# Altium footprint library Connector.PcbLib: 59 footprints (part 4 of 4)
Each footprint in its own frame and in the unit in brackets; x right, y up, seen from the top. Pads: shape width x height; smd on the part's side, far side on the other; paste and mask are expansions set on the pad; w line width, h text height; cw(c..) or ccw(c..) is an arc to the next point about the centre after c.
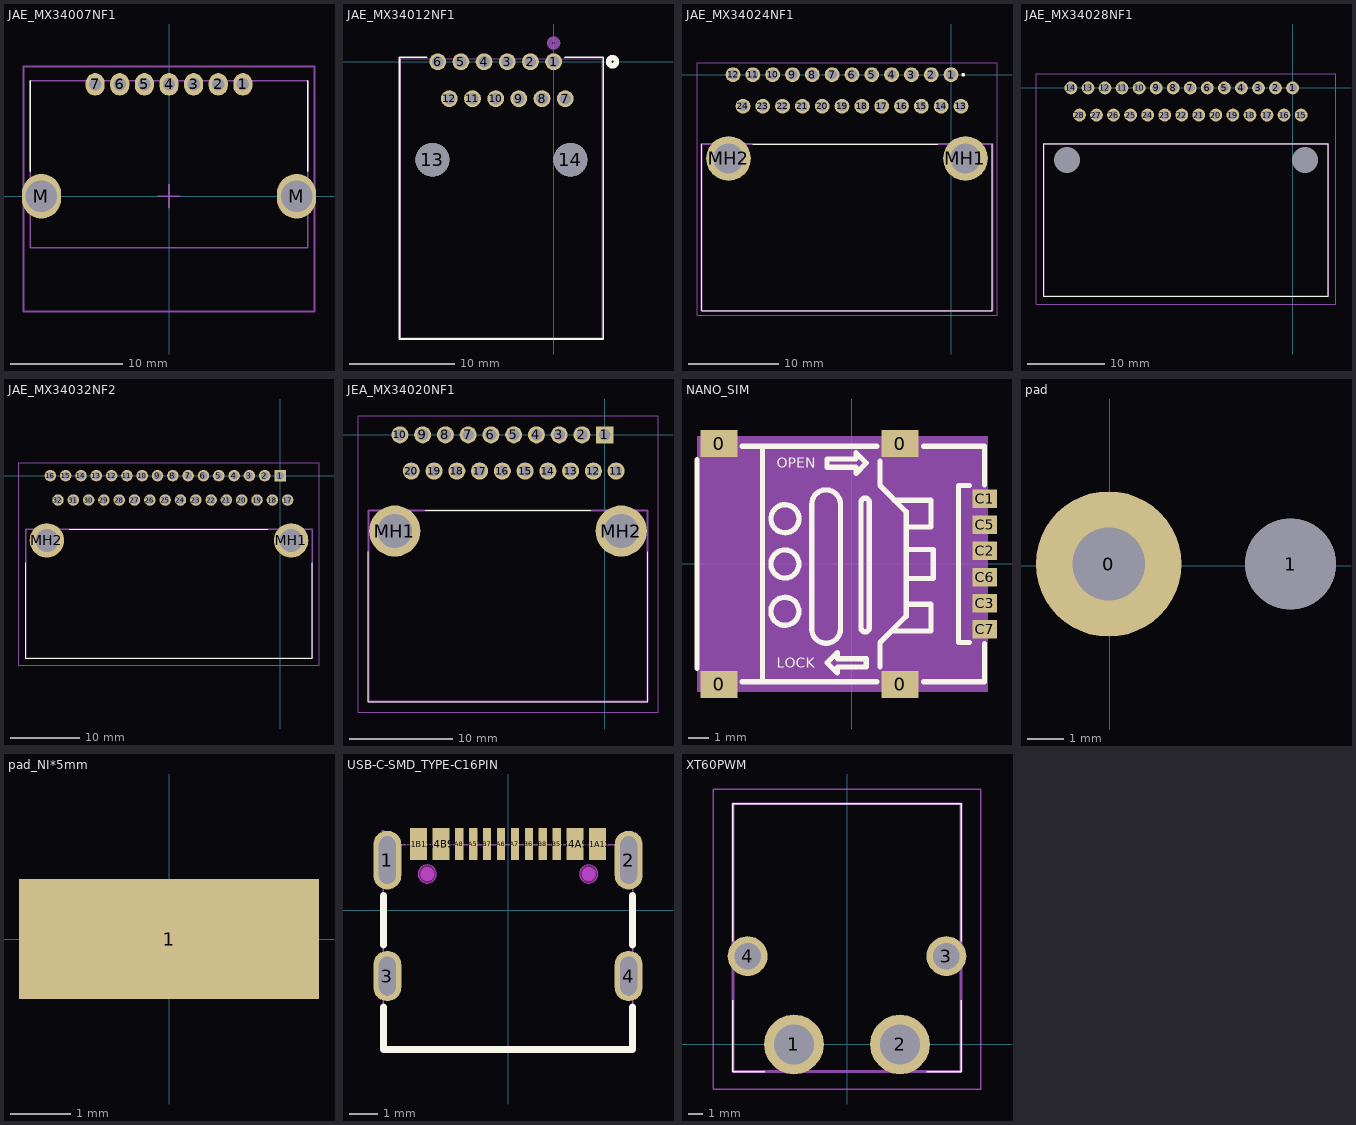
[diagram p3: the footprints below, top view; thin cyan lines are the x and y axes]

## JAE_MX34007NF1 [mm]
pads (9):
  oval 1.7x2 hole 1.1: 1(6.6,10) 2(4.4,10) 3(2.2,10) 4(0,10) 5(-2.2,10) 6(-4.4,10) 7(-6.6,10)
  oval 3.5x4 hole 2.8: M(-11.4,0) M(11.4,0)
Top Overlay:
  lines w0.152: -12.4,2.25 -12.4,10.32 ; 12.4,2.25 12.4,10.32
Mechanical 13:
  lines w0.152: -12.4,-4.6 -12.4,10.32 0,10.32 12.4,10.32 12.4,-4.6 0,-4.6 -12.4,-4.6
Mechanical 15:
  lines w0.152: -1,0 1,0 ; -0.5,-10.3 13,-10.3 13,11.6 0,11.6 -13,11.6 -13,-10.3 0.5,-10.3 ; 0,-1 0,1
3D body "K3D-MX34007NF1-V1_JAE_Proprietary.stp": height 10.7, standoff -3.2, extent -12.4,-10.3 12.4,10.32
3D body "K3D-MX34007SF1-V3_JAE_Proprietary.STEP": height 12.9, standoff 0.7, extent -9.8,-16.5 9.8,4.8

## JAE_MX34012NF1 [mm]
pads (14):
  round 1.6 hole 1.1: 1(0,0) 2(-2.2,0) 3(-4.4,0) 4(-6.6,0) 5(-8.8,0) 6(-11,0) 7(1.1,-3.5) 8(-1.1,-3.5) 9(-3.3,-3.5) 10(-5.5,-3.5) 11(-7.7,-3.5) 12(-9.9,-3.5)
  round 3.2 hole 3.2 unplated: 13(-11.5,-9.3) 14(1.6,-9.3)
Top Overlay:
  circle w0.508: c5.588,0 r0.381
  lines w0.152: -12.049,0.427 -14.627,0.427 -14.627,-26.319 4.727,-26.319 4.727,0.427 1.049,0.427
Bottom Overlay:
  circle w0.508: c5.588,0 r0.381
Mechanical 13:
  circle w0.508: c0,1.778 r0.381
  lines w0.025: -14.5,-26.192 -14.5,0.3 4.6,0.3 4.6,-26.192 -14.5,-26.192
3D body "K3D-MX34012NF1-V3_JAE_Proprietary.STEP": height 16, standoff -3.2, extent -14.55,-26.2 4.55,0.32
3D body "K3D-MX34012SF1-V3_JAE_Proprietary.STEP": height 18.2, standoff 3, extent -13.15,-36 3.15,-14.7

## JAE_MX34024NF1 [mm]
pads (26):
  round 1.65 hole 1.1: 1(0,0) 2(-2.2,0) 3(-4.4,0) 4(-6.6,0) 5(-8.8,0) 6(-11,0) 7(-13.2,0) 8(-15.4,0) 9(-17.6,0) 10(-19.8,0) 11(-22,0) 12(-24.2,0) 13(1.1,-3.5) 14(-1.1,-3.5) 15(-3.3,-3.5) 16(-5.5,-3.5) 17(-7.7,-3.5) 18(-9.9,-3.5) 19(-12.1,-3.5) 20(-14.3,-3.5) 21(-16.5,-3.5) 22(-18.7,-3.5) 23(-20.9,-3.5) 24(-23.1,-3.5)
  round 4.95 hole 3.3: MH1(1.6,-9.3) MH2(-24.7,-9.3)
Top Overlay:
  lines w0.1: -27.7,-7.7 -27.7,-26.2 4.6,-26.2 4.6,-7.7 ; -22,-7.7 -1.5,-7.7
  lines w0.2: 1.35,-0.1 cw(c1.35,0) 1.35,0.1 cw(c1.35,0) 1.35,-0.1
Mechanical 13:
  lines w0.2: -27.7,-26.2 4.6,-26.2 4.6,-7.7 -27.7,-7.7 -27.7,-26.2
Mechanical 15:
  lines w0.1: -28.2,-26.7 5.1,-26.7 5.1,1.325 -28.2,1.325 -28.2,-26.7
3D body "K3D-MX34024NF1-V3_JAE.stp": height 16, standoff -3.2, extent -27.656,-26.108 4.644,0.412

## JAE_MX34028NF1 [mm]
pads (30):
  round 1.65 hole 1.1: 1(0,0) 2(-2.2,0) 3(-4.4,0) 4(-6.6,0) 5(-8.8,0) 6(-11,0) 7(-13.2,0) 8(-15.4,0) 9(-17.6,0) 10(-19.8,0) 11(-22,0) 12(-24.2,0) 13(-26.4,0) 14(-28.6,0) 15(1.1,-3.5) 16(-1.1,-3.5) 17(-3.3,-3.5) 18(-5.5,-3.5) 19(-7.7,-3.5) 20(-9.9,-3.5) 21(-12.1,-3.5) 22(-14.3,-3.5) 23(-16.5,-3.5) 24(-18.7,-3.5) 25(-20.9,-3.5) 26(-23.1,-3.5) 27(-25.3,-3.5) 28(-27.5,-3.5)
  round 1.65 hole 3.3 unplated: MH1(-29.1,-9.3) MH2(1.6,-9.3)
Top Overlay:
  lines w0.1: -32.1,-26.9 -32.1,-7.2 4.6,-7.2 4.6,-26.9 -32.1,-26.9
Mechanical 13:
  lines w0.2: -32.1,-26.9 -32.1,-7.2 4.6,-7.2 4.6,-26.9 -32.1,-26.9
Mechanical 15:
  lines w0.1: -33.1,-27.9 -33.1,1.825 5.6,1.825 5.6,-27.9 -33.1,-27.9
3D body "K3D-MX34028NF2-V2_JAE.stp": height 16, standoff -3.2, extent -32.181,-26.112 4.519,0.408

## JAE_MX34032NF2 [mm]
pads (34):
  rect 1.65x1.65 hole 1.1: 1(0,0)
  round 1.65 hole 1.1: 2(-2.2,0) 3(-4.4,0) 4(-6.6,0) 5(-8.8,0) 6(-11,0) 7(-13.2,0) 8(-15.4,0) 9(-17.6,0) 10(-19.8,0) 11(-22,0) 12(-24.2,0) 13(-26.4,0) 14(-28.6,0) 15(-30.8,0) 16(-33,0) 17(1.1,-3.5) 18(-1.1,-3.5) 19(-3.3,-3.5) 20(-5.5,-3.5) 21(-7.7,-3.5) 22(-9.9,-3.5) 23(-12.1,-3.5) 24(-14.3,-3.5) 25(-16.5,-3.5) 26(-18.7,-3.5) 27(-20.9,-3.5) 28(-23.1,-3.5) 29(-25.3,-3.5) 30(-27.5,-3.5) 31(-29.7,-3.5) 32(-31.9,-3.5)
  round 4.95 hole 3.3: MH1(1.6,-9.3) MH2(-33.5,-9.3)
Top Overlay:
  lines w0.1: -36.5,-26.2 -36.5,-12.5 -36.5,-26.2 ; -36.5,-26.2 4.6,-26.2 ; -36.5,-26.2 4.6,-26.2 ; 4.6,-26.2 4.6,-12.5 4.6,-26.2 ; -30.25,-7.7 -1.75,-7.7 -30.25,-7.7
Mechanical 13:
  lines w0.2: -36.5,-26.2 4.6,-26.2 4.6,-7.7 -36.5,-7.7 -36.5,-26.2
Mechanical 15:
  lines w0.1: -37.5,-27.2 5.6,-27.2 5.6,1.825 -37.5,1.825 -37.5,-27.2
3D body "K3D-MX34032NF2-V2_JAE.stp": height 16, standoff -3.2, extent -36.477,-26.187 4.623,0.333

## JEA_MX34020NF1 [mm]
pads (22):
  rect 1.65x1.65 hole 1.1: 1(0,0)
  round 1.65 hole 1.1: 2(-2.2,0) 3(-4.4,0) 4(-6.6,0) 5(-8.8,0) 6(-11,0) 7(-13.2,0) 8(-15.4,0) 9(-17.6,0) 10(-19.8,0) 11(1.1,-3.5) 12(-1.1,-3.5) 13(-3.3,-3.5) 14(-5.5,-3.5) 15(-7.7,-3.5) 16(-9.9,-3.5) 17(-12.1,-3.5) 18(-14.3,-3.5) 19(-16.5,-3.5) 20(-18.7,-3.5)
  round 4.95 hole 3.3: MH1(-20.3,-9.3) MH2(1.6,-9.3)
Top Overlay:
  lines w0.1: -22.85,-11.3 -22.85,-25.8 4.15,-25.8 4.15,-11.3 ; -17.35,-7.3 -1.35,-7.3
Mechanical 13:
  lines w0.2: -22.85,-25.8 -22.85,-7.3 4.15,-7.3 4.15,-25.8 -22.85,-25.8
Mechanical 15:
  lines w0.1: -23.85,-26.8 -23.85,1.825 5.15,1.825 5.15,-26.8 -23.85,-26.8
3D body "K3D-MX34020NF1-V3_JAE.stp": height 16, standoff -3.2, extent -23.404,-26.163 4.496,0.357

## NANO_SIM [mm]
pads (10):
  rect 1.8x1.3 smd: 0(-6.451,-5.853) 0(-6.451,5.853) 0(2.349,-5.853) 0(2.349,5.853)
  rect 1.2x0.9 smd: C1(6.451,3.173) C2(6.451,0.633) C3(6.451,-1.907) C5(6.451,1.903) C6(6.451,-0.637) C7(6.451,-3.177)
Top Overlay:
  circle w0.254: c-3.251,-2.3 r0.68
  circle w0.254: c-3.251,0 r0.68
  circle w0.254: c-3.249,2.198 r0.68
  lines w0.254: -7.521,-5.08 -7.521,5.08 ; -5.32,-5.715 0.422,-5.715 1.218,-5.715 ; -5.32,5.715 1.218,5.715 ; -4.346,-5.715 -4.346,5.715 ; -1.951,-3.2 -1.951,2.9 cw(c-1.251,2.9) -0.551,2.9 ; -1.951,-3.15 ccw(c-1.251,-3.15) -0.551,-3.15 -0.551,2.95 ; 0.449,-3.1 ccw(c0.649,-3.1) 0.849,-3.1 ; 0.449,-3.099 0.449,3 cw(c0.649,3) 0.849,3 0.848,-3.099 ; 1.369,-4.986 1.369,-3.81 2.639,-2.54 2.639,2.54 1.369,3.81 1.369,4.986 ; 2.049,-3.25 3.849,-3.25 3.849,-1.95 2.649,-1.95 ; 2.049,3.1 3.849,3.1 3.849,1.8 2.649,1.8 ; 2.649,-0.7 2.649,-0.701 3.95,-0.701 3.95,0.701 2.649,0.701 2.649,0.7 ; 3.48,-5.715 6.449,-5.715 6.449,-3.858 ; 3.48,5.715 6.264,5.715 6.449,5.715 6.449,3.855 ; 5.712,-3.81 5.179,-3.81 5.179,3.81 5.716,3.81 ; -1.201,-4.8 -0.701,-5.3 -0.701,-5.001 0.399,-5.001 0.699,-5.001 0.699,-4.599 -0.701,-4.599 -0.701,-4.3 -1.201,-4.8 ; -1.201,4.699 0.199,4.699 0.199,4.4 0.699,4.9 0.198,5.4 0.199,5.101 -0.901,5.101 -1.201,5.101 -1.201,4.699
  text "OPEN" at -3.651,4.678 h0.5
  text "LOCK" at -3.651,-5.05 h0.5
Mechanical 15:
  circle w0.152: c0,0 r0.35
  region: -7.5,6.2 -7.5,-6.2 6.6,-6.2 6.6,6.2
  lines w0.152: -0.5,0 0.5,0 ; 0,-0.5 0,0.5

## pad [mm]
pads (2):
  round 4 hole 2: 0(-0.021,0.044)
  round 2.5 hole 2.5 unplated: 1(4.979,0.044)

## pad_NI*5mm [mm]
pads (1):
  rect 5x2 smd: 1(0,0)

## USB-C-SMD_TYPE-C16PIN [mm]
pads (16):
  oval 1x2.1 hole 0.6 slot 1.7 at 90 deg: 1(-4.32,1.787) 2(4.32,1.787)
  oval 1x1.8 hole 0.6 slot 1.4 at 90 deg: 3(-4.32,-2.362) 4(4.32,-2.362)
  rect 0.6x1.15 smd paste-100: A1B12(-3.2,2.362) A4B9(-2.4,2.362) B1A12(3.2,2.362) B4A9(2.4,2.362)
  rect 0.3x1.15 smd paste-100: A5(-1.25,2.362) A6(-0.25,2.362) A7(0.25,2.362) A8(-1.75,2.362) B5(1.75,2.362) B6(0.75,2.362) B7(-0.75,2.362) B8(1.25,2.362)
Top Overlay:
  lines w0.254: -4.45,-3.482 -4.45,-5 4.45,-5 4.45,-3.482 ; -4.45,-1.243 -4.45,0.518 ; 4.45,-1.243 4.45,0.518
Top Paste:
  drawing of 16 lines, arcs and shapes, not listed
Keep-Out Layer:
  board cut-out: 3.215,1.288 3.215,1.353 3.166,1.472 3.074,1.564 2.955,1.613 2.825,1.613 2.706,1.564 2.615,1.472 2.565,1.353 2.565,1.288 2.565,1.224 2.614,1.104 2.706,1.013 2.825,0.963 2.955,0.963 3.074,1.013 3.165,1.104 3.215,1.223 3.215,1.288
  board cut-out: -2.565,1.288 -2.565,1.353 -2.614,1.472 -2.706,1.564 -2.825,1.613 -2.955,1.613 -3.074,1.564 -3.165,1.472 -3.215,1.353 -3.215,1.288 -3.215,1.224 -3.166,1.104 -3.074,1.013 -2.955,0.963 -2.825,0.963 -2.706,1.013 -2.615,1.104 -2.565,1.223 -2.565,1.288
Mechanical 1:
  circle w0.005: c2.89,1.288 r0.325
  circle w0.005: c-2.89,1.288 r0.325
Mechanical 6:
  circle w0.25: c-2.89,1.288 r0.125
  circle w0.25: c2.89,1.288 r0.125
Mechanical 15:
  region: -4.41,2.803 -4.411,2.827 -4.446,2.86 -4.494,2.86 -4.529,2.827 -4.53,2.803 -4.529,2.778 -4.494,2.745 -4.446,2.745 -4.411,2.778 -4.41,2.803
  region: -3.4,2.802 -3,2.802 -3,2.102 -3.4,2.102
  region: -2.6,2.802 -2.2,2.802 -2.2,2.102 -2.6,2.102
  region: 2.2,2.802 2.6,2.802 2.6,2.102 2.2,2.102
  region: 3,2.802 3.4,2.802 3.4,2.102 3,2.102
  region: -1.35,2.802 -1.15,2.802 -1.15,2.102 -1.35,2.102
  region: -0.85,2.802 -0.65,2.802 -0.65,2.102 -0.85,2.102
  region: -0.35,2.802 -0.15,2.802 -0.15,2.102 -0.35,2.102
  region: 0.15,2.802 0.35,2.802 0.35,2.102 0.15,2.102
  region: 0.65,2.802 0.85,2.802 0.85,2.102 0.65,2.102
  region: 1.15,2.802 1.35,2.802 1.35,2.102 1.15,2.102
  region: 1.65,2.802 1.85,2.802 1.85,2.102 1.65,2.102
  region: -4.47,2.337 -4.17,2.337 -4.17,1.237 -4.47,1.237
  region: 4.17,2.337 4.47,2.337 4.47,1.237 4.17,1.237
  region: 4.17,-1.962 4.47,-1.962 4.47,-2.762 4.17,-2.762
  region: -4.47,-1.962 -4.17,-1.962 -4.17,-2.762 -4.47,-2.762
  region: -1.85,2.803 -1.65,2.803 -1.65,2.103 -1.85,2.103
  lines w0.051: -4.47,-5.012 -4.47,2.338 4.47,2.338 4.47,-5.012 -4.47,-5.012

## XT60PWM [mm]
pads (4):
  round 4.05 hole 2.7: 1(-3.6,0) 2(3.6,0)
  round 2.7 hole 1.8: 3(6.75,6) 4(-6.75,6)
Top Overlay:
  lines w0.1: -7.75,3 -7.75,-1.85 -5.6,-1.85 ; -7.75,7 -7.75,16.35 7.75,16.35 7.75,7 ; 5.4,-1.85 7.75,-1.85 7.75,3
Mechanical 13:
  lines w0.2: -7.75,-1.85 -7.75,16.35 7.75,16.35 7.75,-1.85 -7.75,-1.85
Mechanical 15:
  lines w0.1: -9.1,-3.025 -9.1,17.35 9.1,17.35 9.1,-3.025 -9.1,-3.025
3D body "XT60PW-M.stp": height 8.44, standoff -2.51, extent -7.95,-1.98 7.95,16.298